# Altium footprint library PcbLib1.PcbLib: 209 footprints (part 2 of 14)
Each footprint in its own frame and in the unit in brackets; x right, y up, seen from the top. Pads: shape width x height; smd on the part's side, far side on the other; paste and mask are expansions set on the pad; w line width, h text height; cw(c..) or ccw(c..) is an arc to the next point about the centre after c.
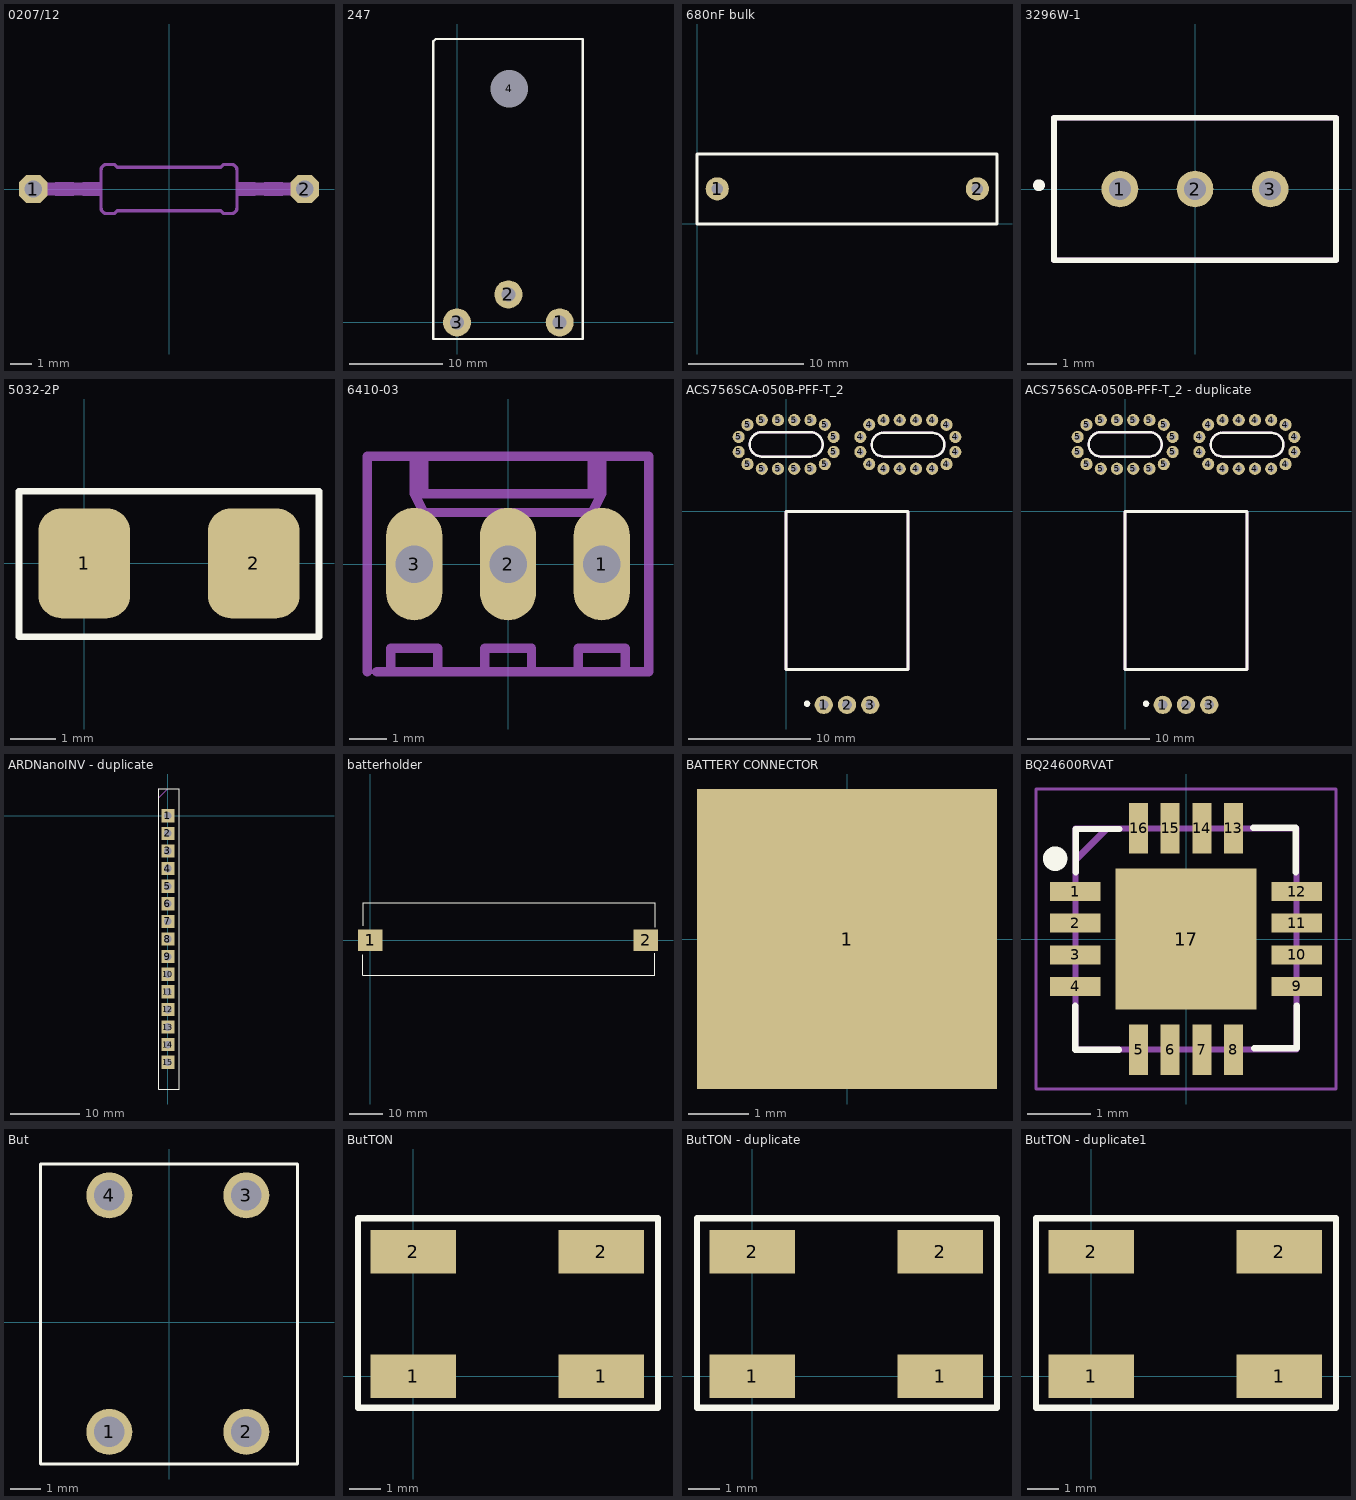
[diagram p1: the footprints below, top view; thin cyan lines are the x and y axes]

## 0207/12 [mil] "0207/12"
pads (2):
  oct 52x52 / inner round 0 / far side oct 52x52 hole 32: 1(-250,0) 2(250,0)
Bottom Assembly:
  lines w24: -250,0 -210,0 ; 210,0 250,0
Bottom 3D Body:
  region: 125,-12 125,12 159,12 159,-12
  region: -159,-12 -159,12 -125,12 -125,-12
  region: 175,-12 175,12 209,12 209,-12
  region: -209,-12 -209,12 -175,12 -175,-12
  lines w6: -125,-35 ccw(c-115,-35) -115,-45 -100,-45 -95,-40 95,-40 100,-45 115,-45 ccw(c115,-35) 125,-35 125,35 ccw(c115,35) 115,45 100,45 95,40 -95,40 -100,45 -115,45 ccw(c-115,35) -125,35 -125,-35
  lines w24: -175,0 -160,0 ; 160,0 175,0
3D body: height 150, standoff 0, extent 197.76,-12.24 262.24,12.24
3D body: height 150, standoff 0, extent -262.24,-12.24 -197.76,12.24
3D body: height 50, standoff 0, extent -274.49,-24.49 -225.51,24.49
3D body: height 50, standoff 0, extent 225.51,-24.49 274.49,24.49

## 247 [mm]
pads (4):
  round 3 hole 1.5: 1(11,0) 2(5.5,3) 3(0,0)
  round 1.524 hole 4: 4(5.588,25.019)
Top Overlay:
  circle w0.254: c5.588,25.019 r1.55
  lines w0.254: -2.54,-1.778 0.349,-1.778 13.462,-1.778 13.462,30.353 -2.286,30.353 -2.54,30.099 -2.54,-1.778
3D body "TO-247_horizontal_back_triangle_margin.stp": height 5.01, standoff -3.59, extent -2.286,-0.314 13.314,30.286

## 680nF bulk [mm]
pads (2):
  round 2 hole 1: 1(1.75,3) 2(24.25,3)
Top Overlay:
  lines w0.254: 0,-0.025 0,6 25.95,6 25.95,-0.025 0,-0.025
3D body "WIMA_FILM_CAPACITOR_RADIAL_26.5x6.0x15.0_P22.5.step": height 15, standoff -3.5, extent -0.35,-0.05 26.15,5.95

## 3296W-1 [mm]
pads (3):
  round 1.24 hole 0.74: 1(-2.54,0) 2(0,0) 3(2.54,0)
Top Overlay:
  circle w0.2: c-5.277,0.127 r0.1
  lines w0.2: -4.765,-2.41 4.765,-2.41 4.765,2.41 -4.765,2.41 -4.765,-2.41
Mechanical 13:
  lines w0.2: -4.765,-2.41 4.765,-2.41 4.765,2.41 -4.765,2.41 -4.765,-2.41
3D body "3296W-1-100LF.stp": height 11.55, standoff -3.01, extent -4.775,-2.476 4.775,2.35

## 5032-2P [mm]
pads (2):
  rrect50% 2x2.4 smd: 1(0,0) 2(3.7,0)
Top Overlay:
  lines w0.15: -1.425,-1.6 -1.425,1.575 5.125,1.575 5.125,-1.6 -1.425,-1.6
3D body "User Library-ABM3-1.STEP": height 1.3, standoff 0, extent -0.7,-1.575 4.3,1.625

## 6410-03 [mil] "6410-03"
pads (3):
  oval 60x120 / inner round 0 / far side oval 60x120 hole 40: 1(100,0) 2(0,0) 3(-100,0)
Bottom Assembly:
  region: -110,-10 -110,10 -90,10 -90,-10
  region: -10,-10 -10,10 10,10 10,-10
  region: 90,-10 90,10 110,10 110,-10
Bottom 3D Body:
  lines w5: -150,-115 -50,-115 -25,-115 ; -100,100 -100,115 -90,115
  lines w10: -150,-115 -150,0 -150,115 -100,115 ; -140,-115 -125,-115 ; -90,115 -90,75 ; 90,115 90,75 ; 100,115 100,75 ; -125,-115 -125,-90 -75,-90 -75,-115 ; -125,-115 -75,-115 ; -100,75 -100,115 ; -100,75 -90,75 ; -100,75 -90,55 90,55 100,75 ; -100,115 -50,115 150,115 150,0 150,-115 125,-115 ; -90,75 90,75 ; -75,-115 -25,-115 ; -25,-115 25,-115 ; -25,-115 -25,-90 25,-90 25,-115 ; 25,-115 75,-115 ; 75,-115 125,-115 ; 75,-115 75,-90 125,-90 125,-115 ; 90,75 100,75
  text "1" at 173.94,-29.06 h77.5
  text "3" at -196.06,-27.06 h77.5
3D body: height 150, standoff 0, extent -110,-10 -90,10
3D body: height 150, standoff 0, extent -10,-10 10,10
3D body: height 150, standoff 0, extent 90,-10 110,10
3D body: height 50, standoff 0, extent -130.26,-60.26 -69.74,60.26
3D body: height 50, standoff 0, extent -30.26,-60.26 30.26,60.26
3D body: height 50, standoff 0, extent 69.74,-60.26 130.26,60.26

## ACS756SCA-050B-PFF-T_2 [mm]
pads (35):
  round 1.5 hole 0.8: 1(3.09,-15.9) 2(5,-15.9) 3(6.91,-15.9)
  round 1 hole 0.5: 4(6.098,4.882) 4(6.098,6.118) 4(6.824,3.882) 4(6.824,7.118) 4(8,3.5) 4(8,7.5) 4(9.333,3.5) 4(9.333,7.5) 4(10.667,3.5) 4(10.667,7.5) 4(12,3.5) 4(12,7.5) 4(13.176,3.882) 4(13.176,7.118) 4(13.902,4.882) 4(13.902,6.118) 5(-3.902,4.882) 5(-3.902,6.118) 5(-3.176,3.882) 5(-3.176,7.118) 5(-2,3.5) 5(-2,7.5) 5(-0.667,3.5) 5(-0.667,7.5) 5(0.667,3.5) 5(0.667,7.5) 5(2,3.5) 5(2,7.5) 5(3.176,3.882) 5(3.176,7.118) 5(3.902,4.882) 5(3.902,6.118)
Top Overlay:
  circle w0.254: c1.715,-15.803 r0.139
  lines w0.2: -2,4.5 cw(c-2,5.5) -2,6.5 2,6.5 cw(c2,5.5) 2,4.5 -2,4.5 ; 8,4.5 cw(c8,5.477) 8,6.455 12.057,6.455 cw(c12.028,5.477) 12.057,4.5 8,4.5
  lines w0.254: 0,-13 10,-13 10,0 0,0 0,-13
Mechanical 13:
  lines w0.2: -2,4.5 cw(c-2,5.5) -2,6.5 2,6.5 cw(c2,5.5) 2,4.5 -2,4.5 ; 8,4.5 cw(c8,5.477) 8,6.455 12.057,6.455 cw(c12.028,5.478) 12.057,4.5 8,4.5
  lines w0.254: 0,-13 10,-13 10,0 0,0 0,-13
3D body "User Library-ACS758-1.STEP": height 7, standoff -3.5, extent -1.95,-16.371 12.05,6.271

## ACS756SCA-050B-PFF-T_2 - duplicate [mm]
pads (35):
  round 1.5 hole 0.8: 1(3.09,-15.9) 2(5,-15.9) 3(6.91,-15.9)
  round 1 hole 0.5: 4(6.098,4.882) 4(6.098,6.118) 4(6.824,3.882) 4(6.824,7.118) 4(8,3.5) 4(8,7.5) 4(9.333,3.5) 4(9.333,7.5) 4(10.667,3.5) 4(10.667,7.5) 4(12,3.5) 4(12,7.5) 4(13.176,3.882) 4(13.176,7.118) 4(13.902,4.882) 4(13.902,6.118) 5(-3.902,4.882) 5(-3.902,6.118) 5(-3.176,3.882) 5(-3.176,7.118) 5(-2,3.5) 5(-2,7.5) 5(-0.667,3.5) 5(-0.667,7.5) 5(0.667,3.5) 5(0.667,7.5) 5(2,3.5) 5(2,7.5) 5(3.176,3.882) 5(3.176,7.118) 5(3.902,4.882) 5(3.902,6.118)
Top Overlay:
  circle w0.254: c1.715,-15.803 r0.139
  lines w0.2: -2,4.5 cw(c-2,5.5) -2,6.5 2,6.5 cw(c2,5.5) 2,4.5 -2,4.5 ; 8,4.5 cw(c8,5.477) 8,6.455 12.057,6.455 cw(c12.028,5.477) 12.057,4.5 8,4.5
  lines w0.254: 0,-13 10,-13 10,0 0,0 0,-13
Mechanical 13:
  lines w0.2: -2,4.5 cw(c-2,5.5) -2,6.5 2,6.5 cw(c2,5.5) 2,4.5 -2,4.5 ; 8,4.5 cw(c8,5.477) 8,6.455 12.057,6.455 cw(c12.028,5.478) 12.057,4.5 8,4.5
  lines w0.254: 0,-13 10,-13 10,0 0,0 0,-13

## ARDNanoINV - duplicate [mm]
pads (15):
  rect 1.9x1.9 hole 1.11: 1(0,0) 2(0,-2.54) 3(0,-5.08) 4(0,-7.62) 5(0,-10.16) 6(0,-12.7) 7(0,-15.24) 8(0,-17.78) 9(0,-20.32) 10(0,-22.86) 11(0,-25.4) 12(0,-27.94) 13(0,-30.48) 14(0,-33.02) 15(0,-35.56)
Top Overlay:
  lines w0.1: -1.32,-39.42 -1.32,3.86 1.651,3.86 1.651,-39.42 -1.32,-39.42
Mechanical 13:
  lines w0.1: -1.32,-39.42 -1.32,3.86 ; -1.32,2.59 -0.05,3.86

## batterholder [mm]
pads (2):
  rect 7.3x6.4 smd: 1(0,0) 2(82,0)
Top Overlay:
  lines w0.254: -2.286,-4.318 -2.286,-10.541 84.709,-10.541 84.709,-3.937 ; -2.159,4.191 -2.159,11.176 84.836,11.176 84.836,3.81
3D body "KEYELCO_1042.STEP": height 14.99, standoff -3.3, extent -1.549,-10.16 84.455,10.49

## BATTERY CONNECTOR [mm]
pads (1):
  rect 5x5 smd: 1(0,0)

## BQ24600RVAT [mm]
pads (17):
  rect 0.8x0.3 smd: 1(-1.75,0.75) 2(-1.75,0.25) 3(-1.75,-0.25) 4(-1.75,-0.75) 9(1.75,-0.75) 10(1.75,-0.25) 11(1.75,0.25) 12(1.75,0.75)
  rect 0.3x0.8 smd: 5(-0.75,-1.75) 6(-0.25,-1.75) 7(0.25,-1.75) 8(0.75,-1.75) 13(0.75,1.75) 14(0.25,1.75) 15(-0.25,1.75) 16(-0.75,1.75)
  rect 2.24x2.24 smd: 17(0,0)
Top Overlay:
  circle w0.254: c-2.072,1.272 r0.066
  lines w0.1: -1.753,-1.056 -1.753,-1.752 -1.06,-1.752 ; -1.747,1.057 -1.747,1.741 -1.054,1.741 ; 1.066,1.76 1.736,1.76 1.736,1.057 ; 1.082,-1.731 1.418,-1.731 1.753,-1.731 1.753,-1.052
Mechanical 13:
  lines w0.1: -1.75,1.25 -1.25,1.75 ; -1.75,-1.75 -1.75,1.75 1.75,1.75 1.75,-1.75 -1.75,-1.75
Mechanical 15:
  lines w0.05: -2.375,-2.375 -2.375,2.375 2.375,2.375 2.375,-2.375 -2.375,-2.375
3D body "BQ24600RVAT.stp": height 1, standoff 0, extent -1.8,-1.8 1.8,1.8

## But [mm]
pads (4):
  round 1.5 hole 1: 1(-1.95,-3.575) 2(2.525,-3.575) 3(2.525,4.15) 4(-1.95,4.15)
Top Overlay:
  lines w0.1: -4.2,-4.625 -1.675,-4.625 1.675,-4.625 4.2,-4.625 4.2,5.175 -4.2,5.175 -4.2,-4.625
3D body "Tactal Switch - SMD (6mmx 6mmx 9mm) - Marked.stp": height 9, standoff 0, extent -2.775,-4.334 3.257,4.684

## ButTON [mm]
pads (4):
  rect 2.75x1.4 smd: 1(0,0) 1(6.05,0) 2(0,4) 2(6.05,4)
Top Overlay:
  lines w0.2: -1.778,-1.016 7.874,-1.016 7.874,5.08 -1.778,5.08 -1.778,-1.016
3D body "Tactal Switch - SMD (6mmx 6mmx 9mm) - Marked.stp": height 9, standoff 0, extent -1.461,-0.984 7.556,5.048

## ButTON - duplicate [mm]
pads (4):
  rect 2.75x1.4 smd: 1(0,0) 1(6.05,0) 2(0,4) 2(6.05,4)
Top Overlay:
  lines w0.2: -1.778,-1.016 7.874,-1.016 7.874,5.08 -1.778,5.08 -1.778,-1.016
3D body "Tactal Switch - SMD (6mmx 6mmx 9mm) - Marked.stp": height 9, standoff 0, extent -1.461,-0.984 7.556,5.048

## ButTON - duplicate1 [mm]
pads (4):
  rect 2.75x1.4 smd: 1(0,0) 1(6.05,0) 2(0,4) 2(6.05,4)
Top Overlay:
  lines w0.2: -1.778,-1.016 -1.778,5.08 7.874,5.08 7.874,-1.016 -1.778,-1.016
3D body "Tactal Switch - SMD (6mmx 6mmx 9mm) - Marked.stp": height 9, standoff 0, extent -1.461,-0.984 7.556,5.048